# Altium integrated library OpenCore_Carrier_Board.IntLib: 44 symbols
Pins are listed as number, name and electrical type; pins without a type are passive.

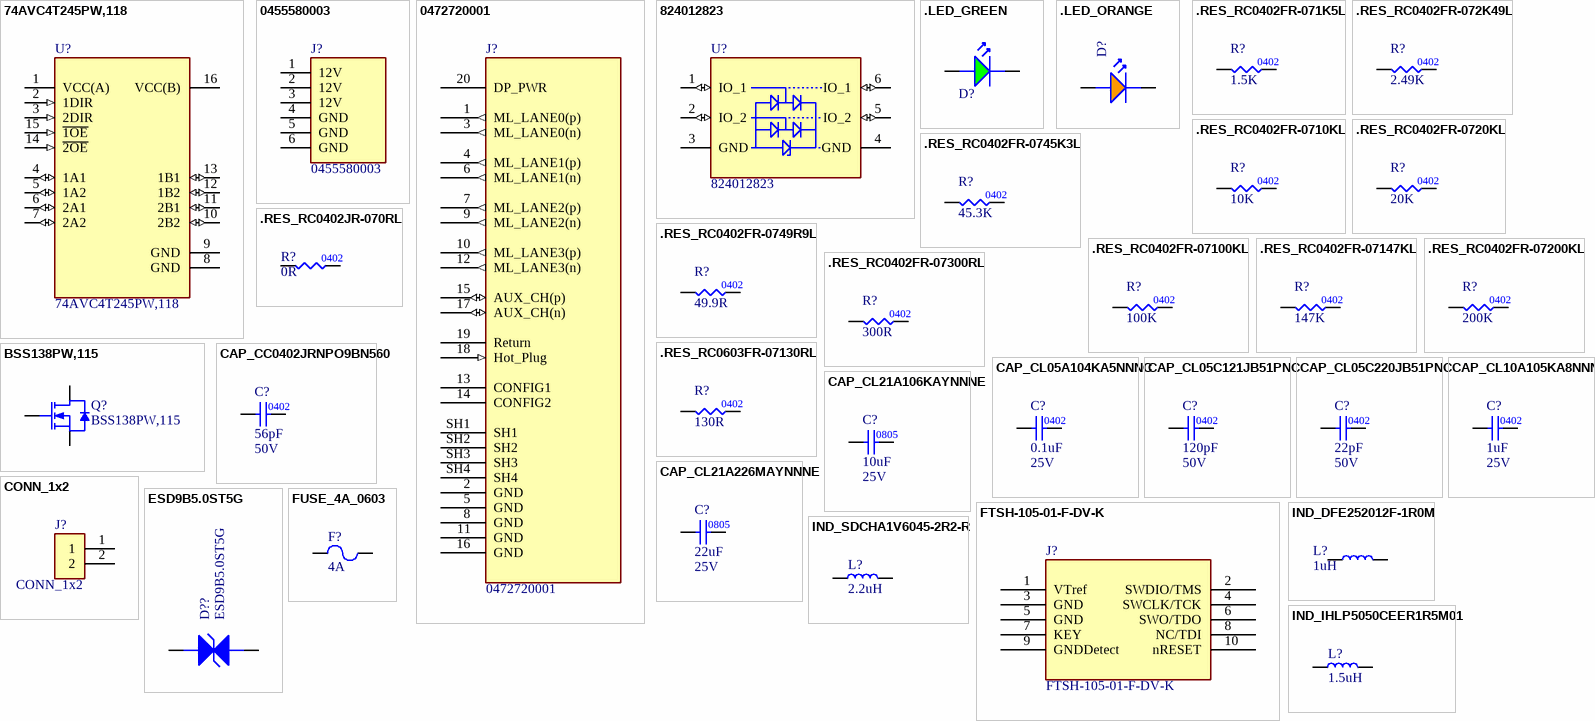
[diagram p0: symbols 74AVC4T245PW,118 to IND_SDCHA1V6045-2R2-R]

## 74AVC4T245PW,118
designator U?
IC TRANSLATION TXRX 3.6V 16TSSOP; Manufacturer_Name: Nexperia; Datasheet Link: https://assets.nexperia.com/documents/data-sheet/74AVC4T245.pdf; Height: 1.1mm; Manufacturer_Part_Number: 74AVC4T245PW,118; Mouser Part Number: 771-74AVC4T245PW118; Mouser Price/Stock: https://www.mouser.co.uk/ProductDetail/Nexperia/74AVC4T245PW118?qs=Lc7Es0%252BIaGKdmOKZhQIwZQ%3D%3D; Arrow Part Number: 74AVC4T245PW,118; Arrow Price/Stock: https://www.arrow.com/en/products/74avc4t245pw118/nexperia?region=nac; Supplier 1: Digi-Key; Supplier Part Number 1: 1727-6573-6-ND
footprint SOP65P640X110-16N
pins: 1 VCC(A) (power), 2 1DIR (in), 3 2DIR (in), 4 1A1 (io), 5 1A2 (io), 6 2A1 (io), 7 2A2 (io), 8 GND (power), 9 GND (power), 10 2B2 (io), 11 2B1 (io), 12 1B2 (io), 13 1B1 (io), 14 ~{2OE} (in), 15 ~{1OE} (in), 16 VCC(B) (power)

## 0455580003
designator J?
Connector Header Through Hole, Right Angle 6 position 0.165" (4.20mm); Manufacturer_Name: Molex; Datasheet Link: http://www.molex.com/pdm_docs/sd/455580003_sd.pdf; Height: 10mm; Manufacturer_Part_Number: 0455580003; Mouser Part Number: N/A; Mouser Price/Stock: https://www.mouser.co.uk/ProductDetail/Molex/0455580003?qs=PBcRNPEHKsr%252BGoTfgbyscA%3D%3D; Arrow Part Number: 0455580003; Arrow Price/Stock: https://www.arrow.com/en/products/0455580003/molex?region=nac
footprint 0455580003
pins: 1 12V (power), 2 12V (power), 3 12V (power), 4 GND (power), 5 GND (power), 6 GND (power)

## 0472720001
designator J?
CONN RCPT DISPLAYPORT 20P SMD RA; Manufacturer_Name: Molex; Datasheet Link: http://www.molex.com/pdm_docs/sd/472720001_sd.pdf; Height: 6.9mm; Manufacturer_Part_Number: 0472720001; Mouser Part Number: N/A; Mouser Price/Stock: https://www.mouser.co.uk/ProductDetail/Molex/0472720001?qs=PBcRNPEHKsrarbeLf7n8sg%3D%3D; Arrow Part Number: 0472720001; Arrow Price/Stock: https://www.arrow.com/en/products/0472720001/molex?region=europe
footprint 0472720001
pins: 1 ML_LANE0(p) (out), 2 GND (power), 3 ML_LANE0(n) (out), 4 ML_LANE1(p) (out), 5 GND (power), 6 ML_LANE1(n) (out), 7 ML_LANE2(p) (out), 8 GND (power), 9 ML_LANE2(n) (out), 10 ML_LANE3(p) (out), 11 GND (power), 12 ML_LANE3(n) (out), 13 CONFIG1, 14 CONFIG2, 15 AUX_CH(p) (io), 16 GND (power), 17 AUX_CH(n) (io), 18 Hot_Plug (in), 19 Return (power), 20 DP_PWR (power), SH1, SH2, SH3, SH4

## 824012823
designator U?
TVS DIODE 3.3VWM 13VC DFN1210-6; Manufacturer_Name: Wurth Elektronik; Voltage Breakdown: 4.5V; Datasheet Link: https://www.we-online.com/catalog/datasheet/824012823.pdf; Height: 0.5mm; Manufacturer_Part_Number: 824012823; Mouser Part Number: 710-824012823; Mouser Price/Stock: https://www.mouser.co.uk/ProductDetail/Wurth-Elektronik/824012823?qs=rrS6PyfT74dPtw7q26tZFg%3D%3D; Supplier 1: Digi-Key; Supplier Part Number: 732-11794-6-ND
footprint 824012823
pins: 1 IO_1 (io), 2 IO_2 (io), 3 GND (power), 4 GND (power), 5 IO_2 (io), 6 IO_1 (io)

## .LED_GREEN
designator D?, comment GENERIC LED - GREEN  (value not drawn)
pins: A Anode, K Cathode

## .LED_ORANGE
designator D?, comment GENERIC LED - ORANGE  (value not drawn)
pins: A Anode, K Cathode

## .RES_RC0402FR-071K5L
designator R?, comment Resistance: 1.5K  (hidden comment: RES_0402)
RES 1.5K OHM 1% 1/16W 0402; Manufacturer: YAGEO; Manufacturer Part Number: RC0402FR-071K5L; Case/Package: 0402; Tolerance: 1%
footprint RES0402 (Chip Resistor, Body 1x0.5mm, IPC Medium Density)
pins: 1, 2

## .RES_RC0402FR-072K49L
designator R?, comment Resistance: 2.49K  (hidden comment: RES_0402)
RES 2.49K OHM 1% 1/16W 0402; Manufacturer: YAGEO; Manufacturer Part Number: RC0402FR-072K49L; Case/Package: 0402; Tolerance: 1%
footprint RES0402 (Chip Resistor, Body 1x0.5mm, IPC Medium Density)
pins: 1, 2

## .RES_RC0402FR-0710KL
designator R?, comment Resistance: 10K  (hidden comment: RES_0402)
RES 10K OHM 1% 1/16W 0402; Manufacturer: YAGEO; Manufacturer Part Number: RC0402FR-0710KL; Case/Package: 0402; Tolerance: 1%
footprint RES0402 (Chip Resistor, Body 1x0.5mm, IPC Medium Density)
pins: 1, 2

## .RES_RC0402FR-0720KL
designator R?, comment Resistance: 20K  (hidden comment: RES_0402)
RES 20K OHM 1% 1/16W 0402; Manufacturer: YAGEO; Manufacturer Part Number: RC0402FR-0720KL; Case/Package: 0402; Tolerance: 1%
footprint RES0402 (Chip Resistor, Body 1x0.5mm, IPC Medium Density)
pins: 1, 2

## .RES_RC0402FR-0745K3L
designator R?, comment Resistance: 45.3K  (hidden comment: RES_0402)
RES 45.3K OHM 1% 1/16W 0402; Manufacturer: YAGEO; Manufacturer Part Number: RC0402FR-0745K3L; Case/Package: 0402; Tolerance: 1%
footprint RES0402 (Chip Resistor, Body 1x0.5mm, IPC Medium Density)
pins: 1, 2

## .RES_RC0402FR-0749R9L
designator R?, comment Resistance: 49.9R  (hidden comment: RES_0402)
RES 49.9 OHM 1% 1/16W 0402; Manufacturer: YAGEO; Manufacturer Part Number: RC0402FR-0749R9L; Case/Package: 0402; Tolerance: 1%
footprint RES0402 (Chip Resistor, Body 1x0.5mm, IPC Medium Density)
pins: 1, 2

## .RES_RC0402FR-07100KL
designator R?, comment Resistance: 100K  (hidden comment: RES_0402)
RES 100K OHM 1% 1/16W 0402; Manufacturer: YAGEO; Manufacturer Part Number: RC0402FR-07100KL; Case/Package: 0402; Tolerance: 1%
footprint RES0402 (Chip Resistor, Body 1x0.5mm, IPC Medium Density)
pins: 1, 2

## .RES_RC0402FR-07147KL
designator R?, comment Resistance: 147K  (hidden comment: RES_0402)
RES 147K OHM 1% 1/16W 0402; Manufacturer: YAGEO; Manufacturer Part Number: RC0402FR-07147KL; Case/Package: 0402; Tolerance: 1%
footprint RES0402 (Chip Resistor, Body 1x0.5mm, IPC Medium Density)
pins: 1, 2

## .RES_RC0402FR-07200KL
designator R?, comment Resistance: 200K  (hidden comment: RES_0402)
RES 200K OHM 1% 1/16W 0402; Manufacturer: YAGEO; Manufacturer Part Number: RC0402FR-07200KL; Case/Package: 0402; Tolerance: 1%
footprint RES0402 (Chip Resistor, Body 1x0.5mm, IPC Medium Density)
pins: 1, 2

## .RES_RC0402FR-07300RL
designator R?, comment Resistance: 300R  (hidden comment: RES_0402)
RES 300 OHM 1% 1/16W 0402; Manufacturer: YAGEO; Manufacturer Part Number: RC0402FR-07300RL; Case/Package: 0402; Tolerance: 1%
footprint RES0402 (Chip Resistor, Body 1x0.5mm, IPC Medium Density)
pins: 1, 2

## .RES_RC0402JR-070RL
designator R?, comment Resistance: 0R  (hidden comment: RES_0402)
RES 0 OHM JUMPER 1/16W 0402; Manufacturer: YAGEO; Manufacturer Part Number: RC0402JR-070RL; Tolerance: 1%; Case/Package: 0402
footprint RES0402 (Chip Resistor, Body 1x0.5mm, IPC Medium Density)
pins: 1, 2

## .RES_RC0603FR-07130RL
designator R?, comment Resistance: 130R  (hidden comment: RES_0402)
RES 130 OHM 1% 1/10W 0603; Manufacturer: YAGEO; Manufacturer Part Number: RC0402FR-0749R9L; Case/Package: 0402; Tolerance: 1%
footprint RES0402 (Chip Resistor, Body 1x0.5mm, IPC Medium Density)
pins: 1, 2

## BSS138PW,115
designator Q?
MOSFET N-CH 60V 320MA SOT323
pins: 1 Source, 2 Gate, 3 Drain

## CAP_CC0402JRNPO9BN560
designator C?, comment value 56pF  Voltage Rating: 50V  (hidden comment: CAP_0402)
CAP CER 56PF 50V C0G/NPO 0402; Manufacturer: YAGEO; Manufacturer Part Number 1: CC0402JRNPO9BN560; Temperature Coefficient: C0G; Tolerance: 5%; Case/Package: 0402; Mounting Type: Surface Mount
footprint CAP0402 (Chip Capacitor, Body 1x0.5mm, Height 0.35mm, IPC Medium Density)
pins: 1, 2

## CAP_CL05A104KA5NNNC
designator C?, comment value 0.1uF  Voltage Rating: 25V  (hidden comment: CAP_0402)
CAP CER 0.1UF 25V X5R 0402; Manufacturer: Samsung Electro-Mechanics; Manufacturer Part Number 1: CL05A104KA5NNNC; Tolerance: 10%; Case/Package: 0402; Mounting Type: Surface Mount; Temperature Coefficient: X5R
footprint CAP0402 (Chip Capacitor, Body 1x0.5mm, Height 0.35mm, IPC Medium Density)
pins: 1, 2

## CAP_CL05C121JB51PNC
designator C?, comment value 120pF  Voltage Rating: 50V  (hidden comment: CAP_0402)
CAP CER 120PF 50V C0G/NP0 0402; Manufacturer: Samsung Electro-Mechanics; Manufacturer Part Number 1: CL05C121JB51PNC; Temperature Coefficient: C0G; Tolerance: 5%; Case/Package: 0402; Mounting Type: Surface Mount
footprint CAP0402 (Chip Capacitor, Body 1x0.5mm, Height 0.35mm, IPC Medium Density)
pins: 1, 2

## CAP_CL05C220JB51PNC
designator C?, comment value 22pF  Voltage Rating: 50V  (hidden comment: CAP_0402)
CAP CER 22PF 50V C0G/NP0 0402; Manufacturer: Samsung Electro-Mechanics; Manufacturer Part Number 1: CL05C220JB51PNC; Temperature Coefficient: C0G; Tolerance: 5%; Case/Package: 0402; Mounting Type: Surface Mount
footprint CAP0402 (Chip Capacitor, Body 1x0.5mm, Height 0.35mm, IPC Medium Density)
pins: 1, 2

## CAP_CL10A105KA8NNNC
designator C?, comment value 1uF  Voltage Rating: 25V  (hidden comment: CAP_0402)
CAP CER 1UF 25V X5R 0603; Manufacturer: Samsung Electro-Mechanics; Manufacturer Part Number 1: CL10A105KA8NNNC; Tolerance: 10%; Case/Package: 0402; Mounting Type: Surface Mount; Temperature Coefficient: X5R
footprint CAP0402 (Chip Capacitor, Body 1x0.5mm, Height 0.35mm, IPC Medium Density)
pins: 1, 2

## CAP_CL21A106KAYNNNE
designator C?, comment value 10uF  Voltage Rating: 25V  (hidden comment: CAP_0805)
CAP CER 10UF 25V X5R 0805; Manufacturer: Samsung Electro-Mechanics; Manufacturer Part Number 1: CL21A106KAYNNNE; Tolerance: 10%; Case/Package: 0805; Mounting Type: Surface Mount; Temperature Coefficient: X5R
footprint CAP0805 (Chip Capacitor, Body 2.0x1.2mm, Height 0.45mm, IPC Medium Density)
pins: 1, 2

## CAP_CL21A226MAYNNNE
designator C?, comment value 22uF  Voltage Rating: 25V  (hidden comment: CAP_0805)
CAP CER 22UF 25V X5R 0805; Manufacturer: Samsung Electro-Mechanics; Manufacturer Part Number 1: CL21A226MAYNNNE; Tolerance: 20%; Case/Package: 0805; Mounting Type: Surface Mount; Temperature Coefficient: X5R
footprint CAP0805 (Chip Capacitor, Body 2.0x1.2mm, Height 0.45mm, IPC Medium Density)
pins: 1, 2

## CONN_1x2
designator J?
footprint 61300211121 (CONN HEADER VERT 2POS 2.54MM)
pins: 1, 2

## ESD9B5.0ST5G
designator D??, comment Manufacturer Part Number: ESD9B5.0ST5G  (hidden comment: TVS DIODE 5VWM SOD923)
Clamp Ipp Tvs Diode Surface Mount SOD-923
pins: A Anode, K Cathode

## FTSH-105-01-F-DV-K
designator J?
CONN HEADER SMD 10POS 1.27MM; Manufacturer: Samtec; Number of Positions: 10; Number of Rows: 2; Manufacturer Part Number 1: FTSH-105-01-F-DV-K
footprint FTSH-105-01-F-DV-K-P-TR (Samtec programming header 10 positions)
pins: 1 VTref (power), 2 SWDIO/TMS, 3 GND (power), 4 SWCLK/TCK, 5 GND (power), 6 SWO/TDO, 7 KEY, 8 NC/TDI, 9 GNDDetect, 10 nRESET

## FUSE_4A_0603
designator F?  Current Rating: 4A  (hidden comment: FUSE_4A_0603)
FUSE SMD 4A 32V; Manufacturer 1: Vishay; Manufacturer Part Number 1: MFU0603FF04000P500; Package/Footprint: 0603; Voltage Rating (DC): 32V; Supplier 1: Digi-Key; Mounting Type: SMD; Supplier Part Number 1: 749-MFU0603FF04000P500DKR-ND
footprint FUSE_0603 (Chip Fuse, Body 1.6x0.81mm)
pins: 1, 2

## IND_DFE252012F-1R0M
designator L?, comment Inductance: 1uH  (hidden comment: DFE252012F-1R0M)
FIXED IND 1UH 3.3A 0.04OHM SMD; Manufacturer: Murata Electronics; Saturation Current: 4.7A; DC Resistance (DCR): 40mOhm; Tolerance: 20%; Case/Package: 2520; Manufacturer Part Number: DFE252012F-1R0M; Current Rating: 3.3A
footprint IND_2520
pins: 1, 2

## IND_IHLP5050CEER1R5M01
designator L?, comment Inductance: 1.5uH  (hidden comment: IHLP5050CEER1R5M01)
FIXED IND 1.5UH 19A 5.5 MOHM SMD; Manufacturer: Vishay Dale; Saturation Current: 35A; Tolerance: 20%; Case/Package: Nonstandard; Manufacturer Part Number: IHLP5050CEER1R5M01; Current Rating: 19A; DC Resistance (DCR): 5.5mOhm
footprint IHLP5050CEER1R5M01 (Vishay Dale Inductor - 13.2mm x 12.9mm)
pins: 1, 2

## IND_SDCHA1V6045-2R2-R
designator L?, comment Inductance: 2.2uH  (hidden comment: SDCHA1V6045-2R2-R)
IND SMD POWER 2.2UH 6.0A; Manufacturer: Eaton - Electronics Division; Saturation Current: 9.5A; Current Rating: 6A; DC Resistance (DCR): 15mOhm; Tolerance: 20%; Case/Package: Nonstandard; Manufacturer Part Number: SDCHA1V6045-2R2-R
footprint SDCHA1V6045-2R2-R (Eaton 6mm x 6mm)
pins: 1, 2

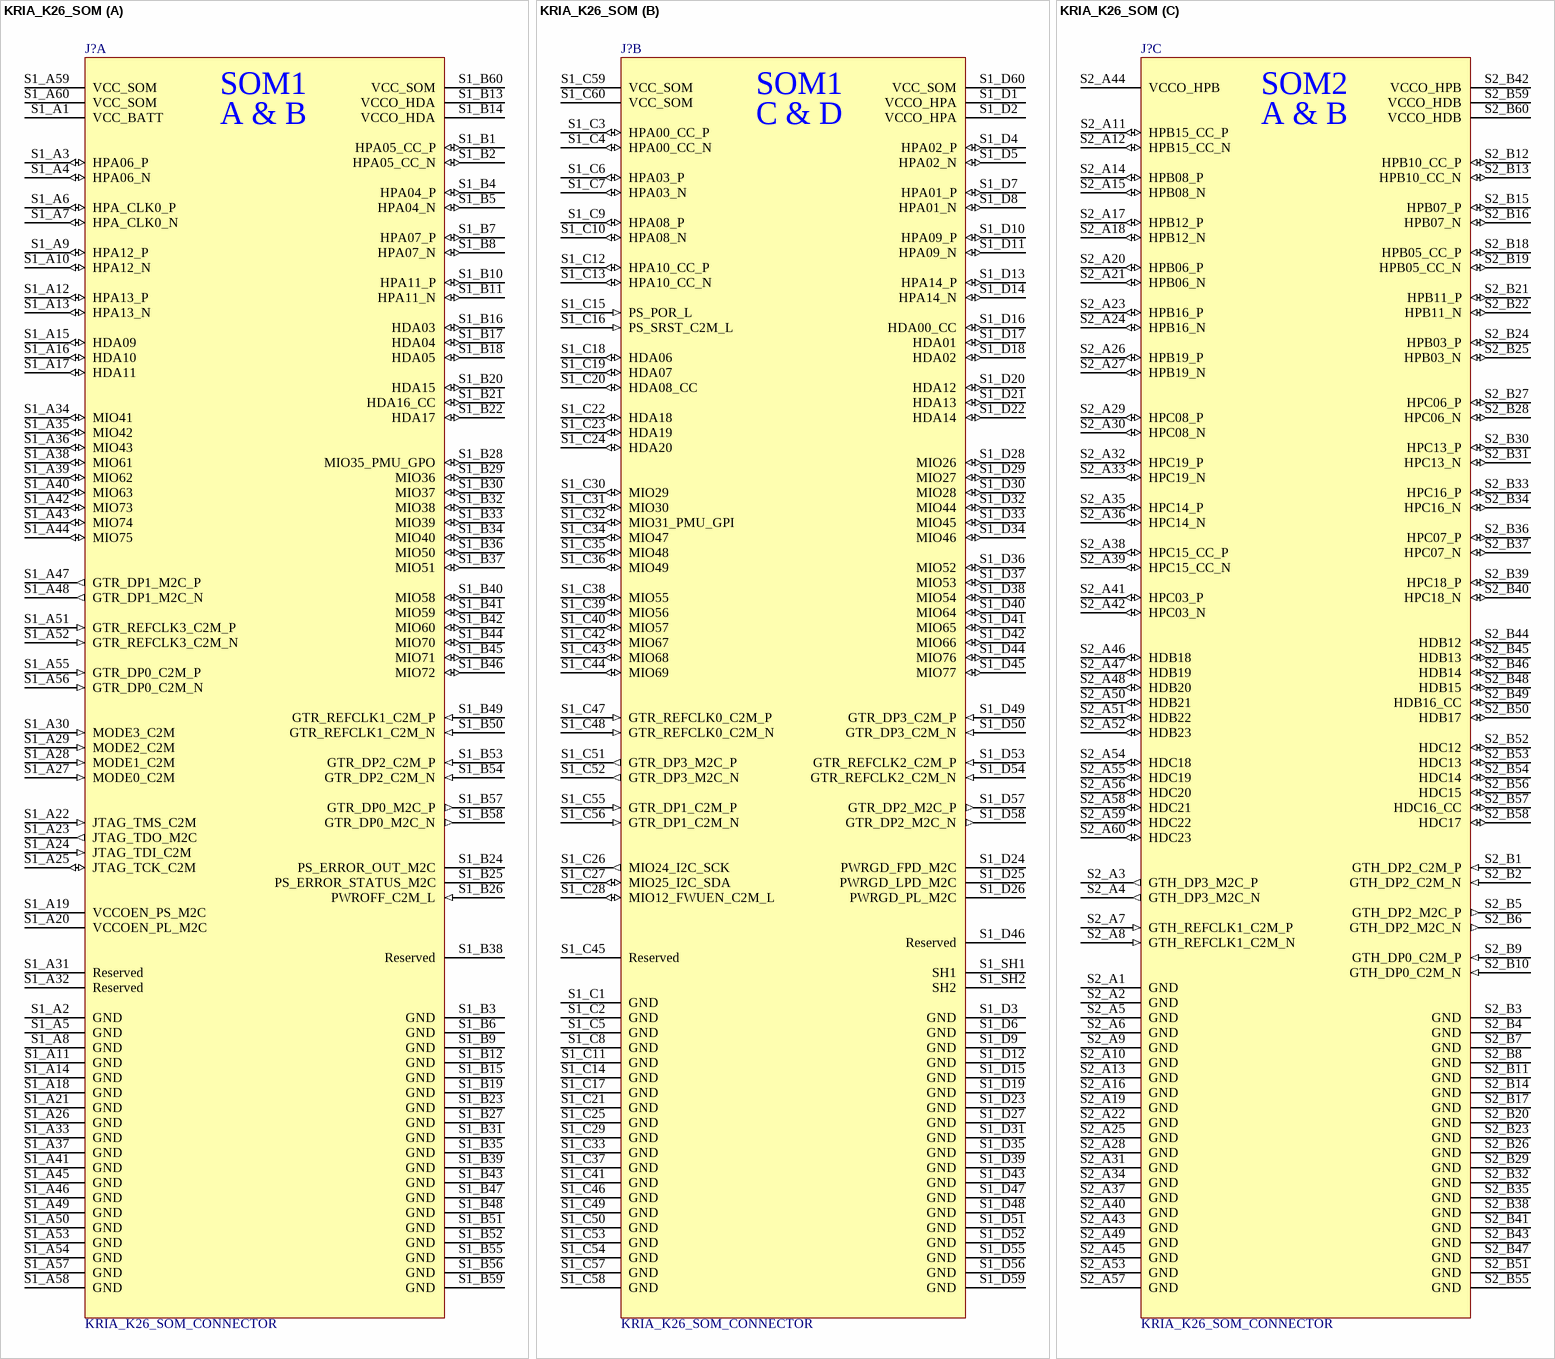
[diagram p1: symbol KRIA_K26_SOM]

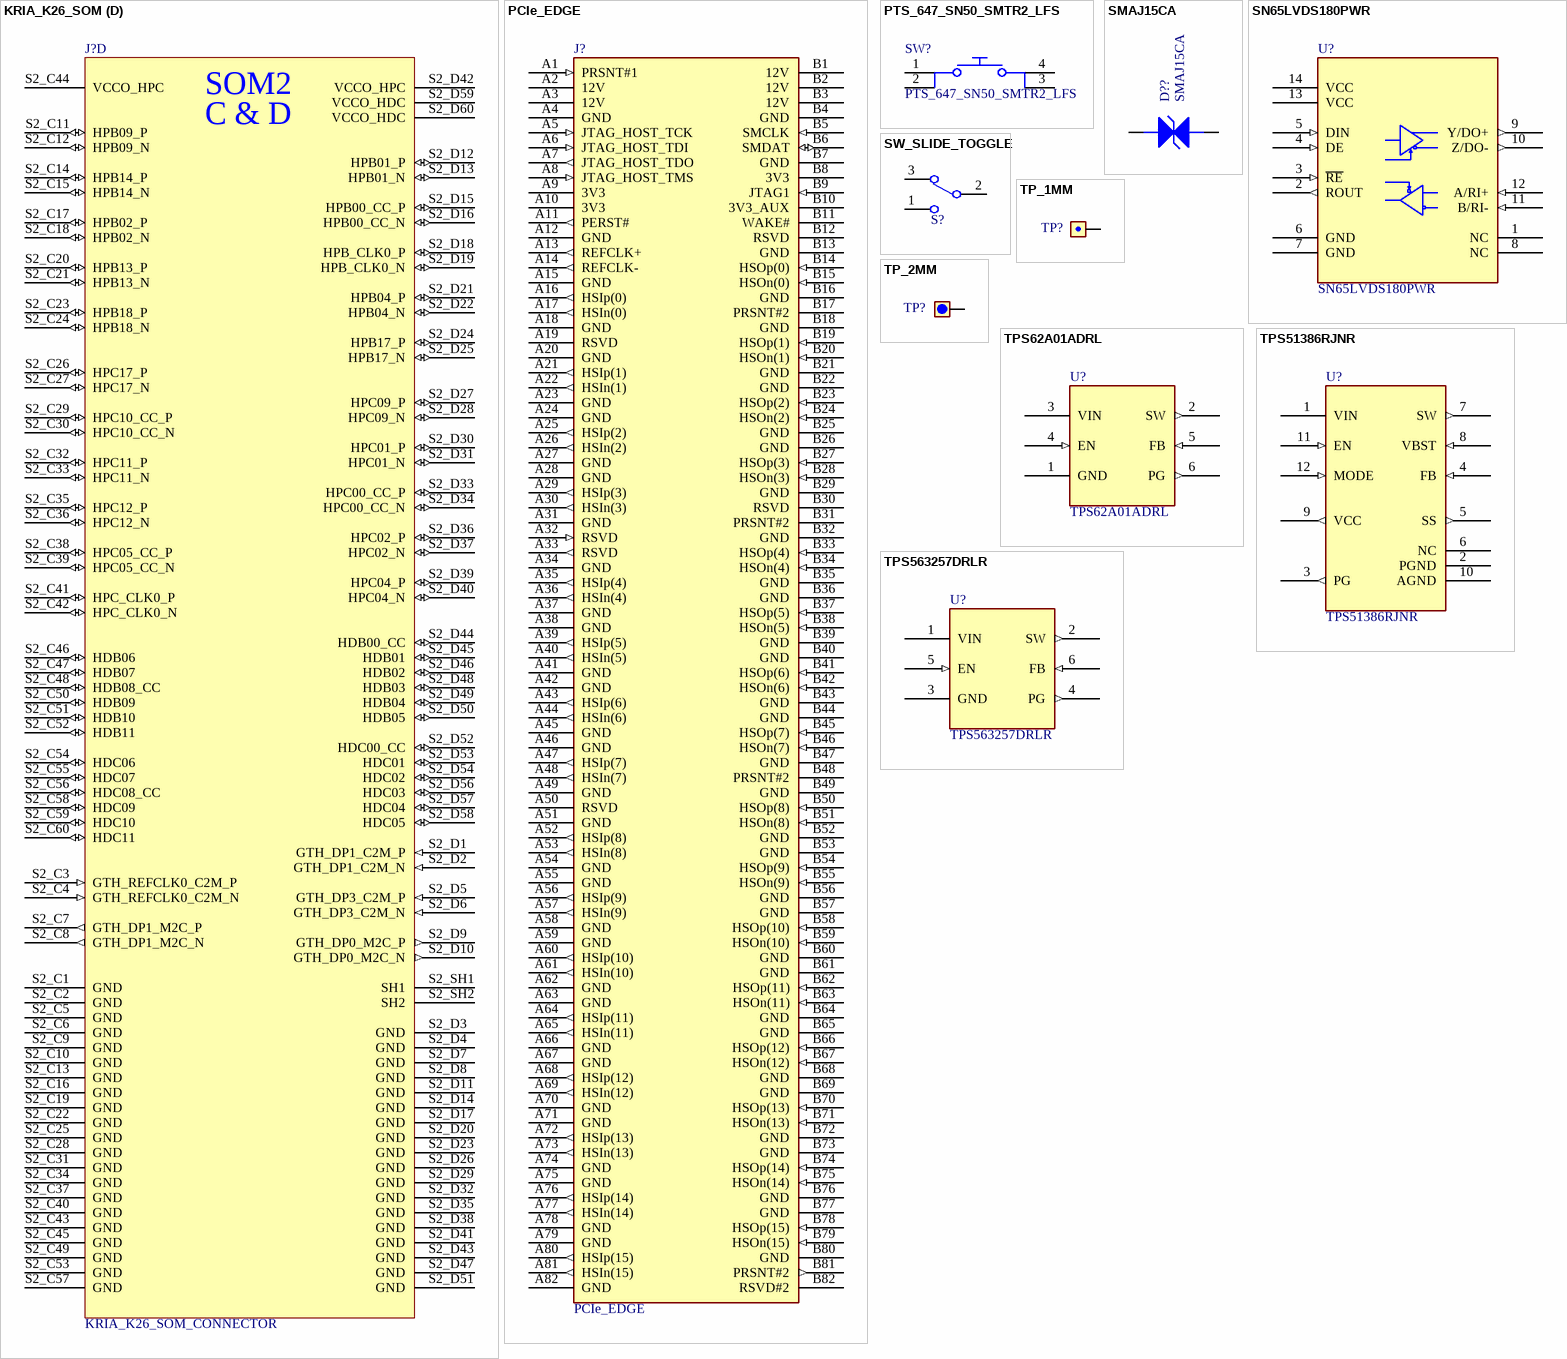
[diagram p2: symbols KRIA_K26_SOM to TPS563257DRLR]

## KRIA_K26_SOM
designator J?, comment KRIA_K26_SOM_CONNECTOR
2 x 240 pos Samtec REF-226081-01; Number of Positions: 480; Manufacturer: Samtec; Manufacturer Part NUmber: REF-226081-01; Number of Rows: 8
footprint KRIA_K26_SOM
part A pins: S1_A1 VCC_BATT (power) "PS BBRAM and real-time clock (RTC) supply voltage, requires external battery. Connect to GND when battery is not used.", S1_A2 GND (power) "Ground, connect to carrier card ground plane", S1_A3 HPA06_P (io) "HPIO on bank 66", S1_A4 HPA06_N (io) "HPIO on bank 66", S1_A5 GND (power) "Ground, connect to carrier card ground plane", S1_A6 HPA_CLK0_P (io) "HPIO global clock pin on bank 66", S1_A7 HPA_CLK0_N (io) "HPIO global clock pin on bank 66", S1_A8 GND (power) "Ground, connect to carrier card ground plane", S1_A9 HPA12_P (io) "HPIO on bank 66", S1_A10 HPA12_N (io) "HPIO on bank 66", S1_A11 GND (power) "Ground, connect to carrier card ground plane", S1_A12 HPA13_P (io) "HPIO on bank 66", S1_A13 HPA13_N (io) "HPIO on bank 66", S1_A14 GND (power) "Ground, connect to carrier card ground plane", S1_A15 HDA09 (io) "HDIO on bank 45", S1_A16 HDA10 (io) "HDIO on bank 45", S1_A17 HDA11 (io) "HDIO on bank 45", S1_A18 GND (power) "Ground, connect to carrier card ground plane", S1_A19 VCCOEN_PS_M2C "Indication to turn on power for PS I/O peripherals on the carrier card", S1_A20 VCCOEN_PL_M2C "Indication to turn on power for PL /IO peripherals on the carrier card", S1_A21 GND (power) "Ground, connect to carrier card ground plane", S1_A22 JTAG_TMS_C2M (in) "JTAG mode select", S1_A23 JTAG_TDO_M2C (out) "JTAG data out", S1_A24 JTAG_TDI_C2M (in) "JTAG data in", S1_A25 JTAG_TCK_C2M (io) "JTAG clock", S1_A26 GND (power) "Ground, connect to carrier card ground plane", S1_A27 MODE0_C2M (in) "PS mode bit 0", S1_A28 MODE1_C2M (in) "PS mode bit 1", S1_A29 MODE2_C2M (in) "PS mode bit 2", S1_A30 MODE3_C2M (in) "PS mode bit 3", S1_A31 Reserved "No connect on the SOM", S1_A32 Reserved "No connect on the SOM", S1_A33 GND (power) "Ground, connect to carrier card ground plane", S1_A34 MIO41 (io) "PS MIO signal on bank 501", S1_A35 MIO42 (io) "PS MIO signal on bank 501", S1_A36 MIO43 (io) "PS MIO signal on bank 501", S1_A37 GND (power) "Ground, connect to carrier card ground plane", S1_A38 MIO61 (io) "PS MIO signal on bank 502", S1_A39 MIO62 (io) "PS MIO signal on bank 502", S1_A40 MIO63 (io) "PS MIO signal on bank 502", S1_A41 GND (power) "Ground, connect to carrier card ground plane", S1_A42 MIO73 (io) "PS MIO signal on bank 502", S1_A43 MIO74 (io) "PS MIO signal on bank 502", S1_A44 MIO75 (io) "PS MIO signal on bank 502", S1_A45 GND (power) "Ground, connect to carrier card ground plane", S1_A46 GND (power) "Ground, connect to carrier card ground plane", S1_A47 GTR_DP1_M2C_P (out) "PS-GTR lane 1 TX, bank 505", S1_A48 GTR_DP1_M2C_N (out) "PS-GTR lane 1 TX, bank 505", S1_A49 GND (power) "Ground, connect to carrier card ground plane", S1_A50 GND (power) "Ground, connect to carrier card ground plane", S1_A51 GTR_REFCLK3_C2M_P (in) "PS-GTR REFCLK3 input, bank 505", S1_A52 GTR_REFCLK3_C2M_N (in) "PS-GTR REFCLK3 input, bank 505", S1_A53 GND (power) "Ground, connect to carrier card ground plane", S1_A54 GND (power) "Ground, connect to carrier card ground plane", S1_A55 GTR_DP0_C2M_P (in) "PS-GTR lane 0 RX, bank 505", S1_A56 GTR_DP0_C2M_N (in) "PS-GTR lane 0 RX, bank 505", S1_A57 GND (power) "Ground, connect to carrier card ground plane", S1_A58 GND (power) "Ground, connect to carrier card ground plane", S1_A59 VCC_SOM (power) "SOM main supply voltage, +5V", S1_A60 VCC_SOM (power) "SOM main supply voltage, +5V", S1_B1 HPA05_CC_P (io) "HPIO clock-capable pin on bank 66", S1_B2 HPA05_CC_N (io) "HPIO clock-capable pin on bank 66", S1_B3 GND (power) "Ground, connect to carrier card ground plane", S1_B4 HPA04_P (io) "HPIO on bank 66", S1_B5 HPA04_N (io) "HPIO on bank 66", S1_B6 GND (power) "Ground, connect to carrier card ground plane", S1_B7 HPA07_P (io) "HPIO on bank 66", S1_B8 HPA07_N (io) "HPIO on bank 66", S1_B9 GND (power) "Ground, connect to carrier card ground plane", S1_B10 HPA11_P (io) "HPIO on bank 66", S1_B11 HPA11_N (io) "HPIO on bank 66", S1_B12 GND (power) "Ground, connect to carrier card ground plane", S1_B13 VCCO_HDA (power) "HDA I/O voltage rail, 1.2V to 3.3V", S1_B14 VCCO_HDA (power) "HDA I/O voltage rail, 1.2V to 3.3V", S1_B15 GND (power) "Ground, connect to carrier card ground plane", S1_B16 HDA03 (io) "HDIO on bank 45", S1_B17 HDA04 (io) "HDIO on bank 45", S1_B18 HDA05 (io) "HDIO on bank 45", S1_B19 GND (power) "Ground, connect to carrier card ground plane", S1_B20 HDA15 (io) "HDIO on bank 45", S1_B21 HDA16_CC (io) "HDIO clock-capable pin on bank 45", S1_B22 HDA17 (io) "HDIO on bank 45", S1_B23 GND (power) "Ground, connect to carrier card ground plane", S1_B24 PS_ERROR_OUT_M2C "PS error indication from SOM", S1_B25 PS_ERROR_STATUS_M2C "PS error status from SOM", S1_B26 PWROFF_C2M_L (in) "Control signal to turn off all power rails on the SOM", S1_B27 GND (power) "Ground, connect to carrier card ground plane", S1_B28 MIO35_PMU_GPO (io) "PS MIO signal on bank 501. Optional use as PMU output mapped to PMU function (e.g., watchdog or reset).", S1_B29 MIO36 (io) "PS MIO signal on bank 501. Optional use as PMU output. Default use as UART txd in the released Kria PetaLinux BSPs.", S1_B30 MIO37 (io) "PS MIO signal on bank 501. Optional use as PMU output. Default use as UART rxd in the released Kria PetaLinux BSPs.", S1_B31 GND (power) "Ground, connect to carrier card ground plane", S1_B32 MIO38 (io) "PS MIO signal on bank 501", S1_B33 MIO39 (io) "PS MIO signal on bank 501", S1_B34 MIO40 (io) "PS MIO signal on bank 501", S1_B35 GND (power) "Ground, connect to carrier card ground plane", S1_B36 MIO50 (io) "PS MIO signal on bank 501", S1_B37 MIO51 (io) "PS MIO signal on bank 501", S1_B38 Reserved "Not connected to SOM connector", S1_B39 GND (power) "Ground, connect to carrier card ground plane", S1_B40 MIO58 (io) "PS MIO signal on bank 502", S1_B41 MIO59 (io) "PS MIO signal on bank 502", S1_B42 MIO60 (io) "PS MIO signal on bank 502", S1_B43 GND (power) "Ground, connect to carrier card ground plane", S1_B44 MIO70 (io) "PS MIO signal on bank 502", S1_B45 MIO71 (io) "PS MIO signal on bank 502", S1_B46 MIO72 (io) "PS MIO signal on bank 502", S1_B47 GND (power) "Ground, connect to carrier card ground plane", S1_B48 GND (power) "Ground, connect to carrier card ground plane", S1_B49 GTR_REFCLK1_C2M_P (in) "PS-GTR REFCLK1 input, bank 505", S1_B50 GTR_REFCLK1_C2M_N (in) "PS-GTR REFCLK1 input, bank 505", S1_B51 GND (power) "Ground, connect to carrier card ground plane", S1_B52 GND (power) "Ground, connect to carrier card ground plane", S1_B53 GTR_DP2_C2M_P (in) "PS-GTR lane 2 RX, bank 505", S1_B54 GTR_DP2_C2M_N (in) "PS-GTR lane 2 RX, bank 505", S1_B55 GND (power) "Ground, connect to carrier card ground plane", S1_B56 GND (power) "Ground, connect to carrier card ground plane", S1_B57 GTR_DP0_M2C_P (out) "PS-GTR lane 0 TX, bank 505", S1_B58 GTR_DP0_M2C_N (out) "PS-GTR lane 0 TX, bank 505", S1_B59 GND (power) "Ground, connect to carrier card ground plane", S1_B60 VCC_SOM (power) "SOM main supply voltage, +5V"